# Altium footprint library M_Derogarian Altium Library.PcbLib: 137 footprints (part 4 of 9)
Each footprint in its own frame and in the unit in brackets; x right, y up, seen from the top. Pads: shape width x height; smd on the part's side, far side on the other; paste and mask are expansions set on the pad; w line width, h text height; cw(c..) or ccw(c..) is an arc to the next point about the centre after c.
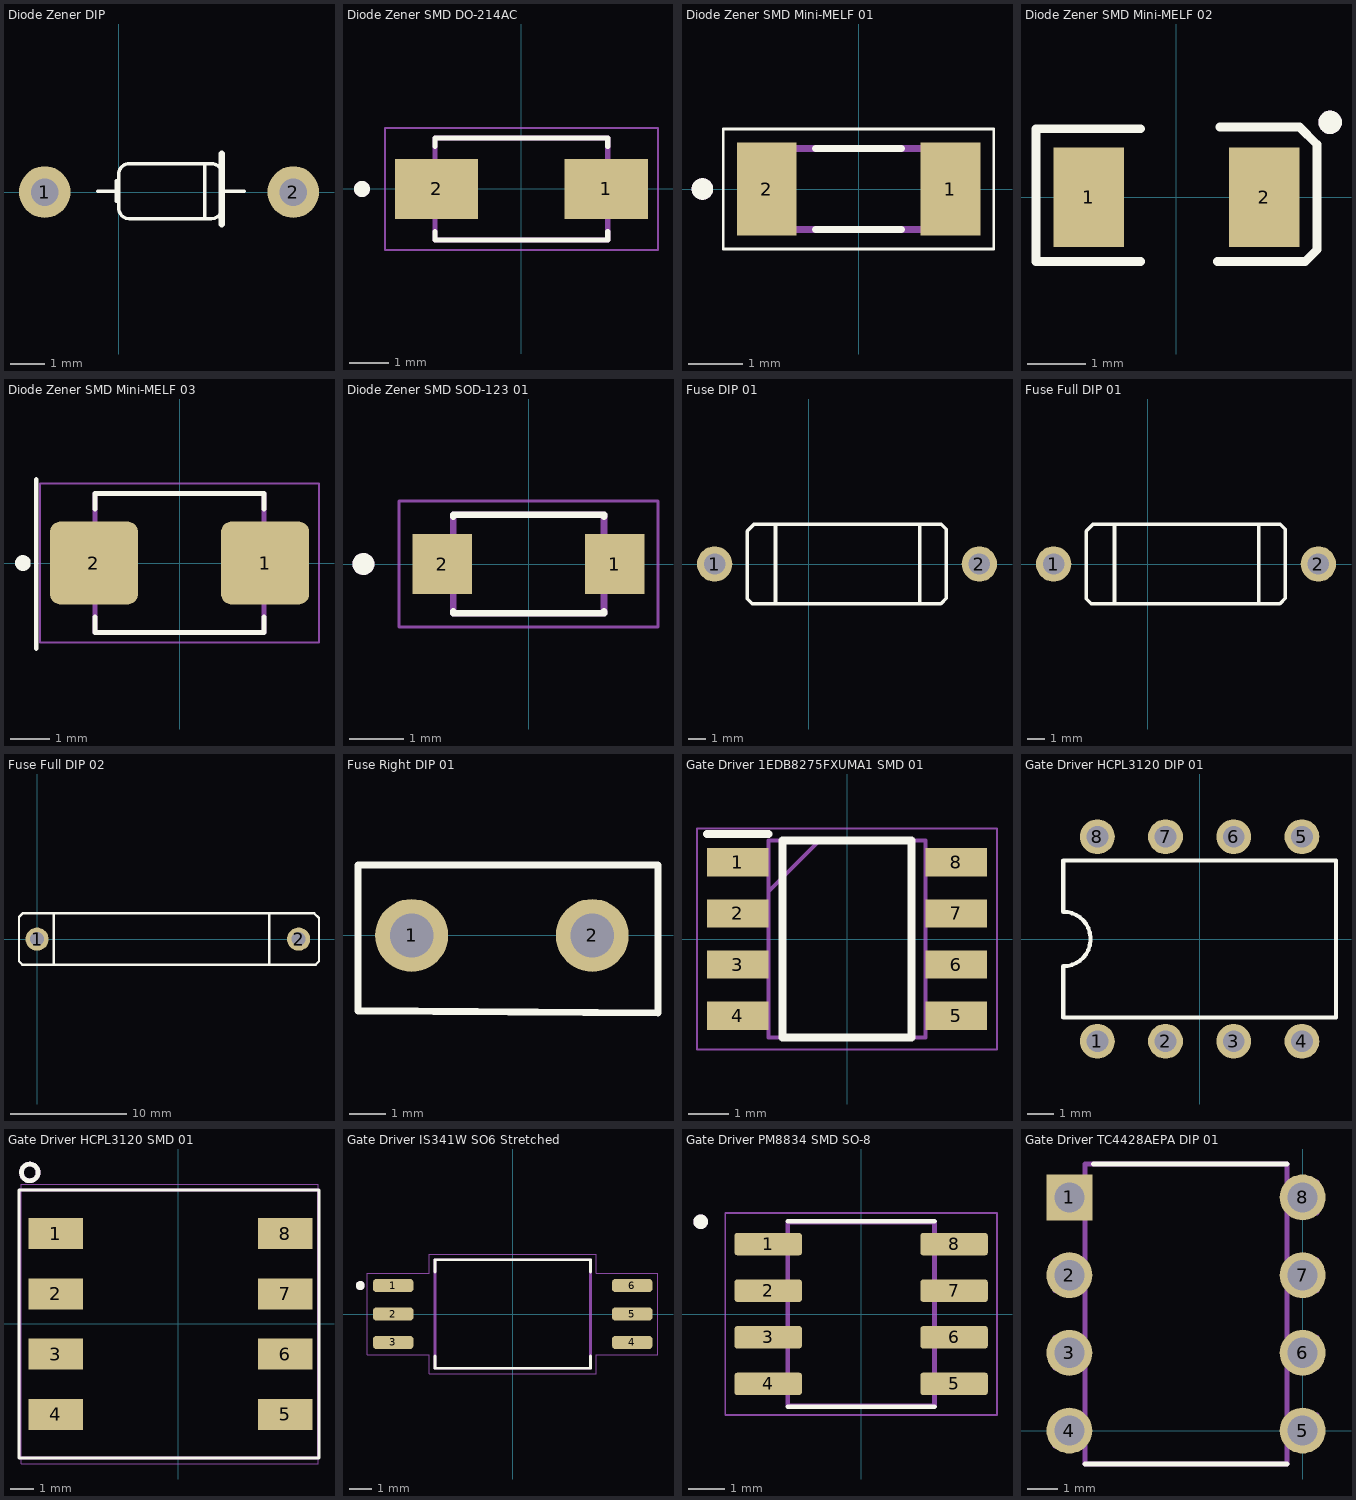
[diagram p3: the footprints below, top view; thin cyan lines are the x and y axes]

## Diode Zener DIP [mm]
pads (2):
  round 1.5 hole 0.8: 1(-2.159,0) 2(5.08,0)
Top Overlay:
  lines w0.1: -0.61,0.025 -0.101,0.025 ; -0.074,-0.275 -0.074,0.325 ; 3.658,0.025 2.999,0.025 ; 2.499,-0.775 2.699,-0.775 ccw(c2.699,-0.475) 2.999,-0.475 2.999,0.025 ; 2.499,-0.775 0.299,-0.775 cw(c0.299,-0.475) -0.001,-0.475 -0.001,0.525 cw(c0.299,0.525) 0.299,0.825 2.499,0.825 ; 2.499,-0.775 2.499,0.825 ; 2.499,0.825 2.699,0.825 cw(c2.699,0.525) 2.999,0.525 2.999,0.025
  lines w0.2: 2.995,-0.94 2.995,1.118
3D body "User Library-Diodo 1N914 (Pitch 280mils).STEP": height 1.84, standoff -2.82, extent -2.464,-0.686 5.264,0.991

## Diode Zener SMD DO-214AC [mm]
height 2.5
pads (2):
  rect 2.09x1.5 smd: 1(2.13,0) 2(-2.13,0)
Top Overlay:
  circle w0.2: c-4,0 r0.1
  lines w0.127: -2.165,-1.07 -2.165,-1.28 2.165,-1.28 2.165,-1.07 ; -2.165,1.07 -2.165,1.28 2.165,1.28 2.165,1.07
Mechanical 13:
  circle w0.2: c-4,0 r0.1
  lines w0.127: -2.165,-1.28 2.165,-1.28 2.165,1.28 -2.165,1.28 -2.165,-1.28
Mechanical 15:
  lines w0.05: -3.425,-1.53 3.425,-1.53 3.425,1.53 -3.425,1.53 -3.425,-1.53
3D body "step_temp.STEP": height 2.5, standoff 0, extent -2.57,-1.28 2.57,1.28

## Diode Zener SMD Mini-MELF 01 [mm]
pads (2):
  rect 1.11x1.73 smd: 1(1.705,0) 2(-1.705,0)
Top Overlay:
  circle w0.2: c-2.9,0 r0.1
  lines w0.05: -2.51,-1.115 2.51,-1.115 2.51,1.115 -2.51,1.115 -2.51,-1.115
  lines w0.127: -0.8,-0.75 0.8,-0.75 ; -0.8,0.75 0.8,0.75
Mechanical 13:
  circle w0.2: c-2.9,0 r0.1
  lines w0.127: -1.75,-0.75 -1.75,0.75 1.75,0.75 1.75,-0.75 -1.75,-0.75
3D body "BZT55B22 L0G.STEP": height 1.6, standoff 0, extent -1.64,-0.83 1.86,0.77

## Diode Zener SMD Mini-MELF 02 [mm]
pads (2):
  rect 1.2x1.7 smd: 1(-1.5,0) 2(1.5,0)
Top Overlay:
  circle w0.2: c2.625,1.278 r0.1
  lines w0.15: -0.611,-1.1 -2.4,-1.1 -2.4,1.17 -0.611,1.17 ; 0.7,-1.1 2.2,-1.1 2.4,-0.9 2.4,-0.5 2.4,0.9 2.1,1.2 0.74,1.2
Mechanical 13:
  circle w0.2: c2.625,1.278 r0.1
3D body "User Library-MiniMelf-2.STEP": height 1.6, standoff 0, extent -1.71,-0.81 1.99,0.79

## Diode Zener SMD Mini-MELF 03 [mm]
pads (2):
  rrect25% 2.25x2.12 smd: 1(2.185,0) 2(-2.185,0)
Top Overlay:
  circle w0.2: c-4,0 r0.1
  lines w0.127: -3.66,-2.185 -3.66,2.135 ; -2.16,-1.374 -2.16,-1.78 2.16,-1.78 2.16,-1.374 ; -2.16,1.374 -2.16,1.78 2.16,1.78 2.16,1.374
Mechanical 13:
  lines w0.127: -2.16,-1.78 2.16,-1.78 2.16,1.78 -2.16,1.78 -2.16,-1.78
Mechanical 15:
  lines w0.05: -3.56,-2.03 -3.56,2.03 3.56,2.03 3.56,-2.03 -3.56,-2.03
3D body "step_temp.STEP": height 2.49, standoff 0.02, extent -2.72,-1.78 2.72,1.78

## Diode Zener SMD SOD-123 01 [mm]
height 1.02
pads (2):
  rect 1.08x1.09 smd: 1(1.575,0) 2(-1.575,0)
Top Overlay:
  circle w0.2: c-3.015,0 r0.1
  lines w0.127: -1.375,-0.865 -1.375,-0.9 1.375,-0.9 1.375,-0.865 ; -1.375,0.865 -1.375,0.9 1.375,0.9 1.375,0.865
Mechanical 13:
  circle w0.2: c-3.015,0 r0.1
  lines w0.127: -1.375,-0.9 1.375,-0.9 1.375,0.9 -1.375,0.9 -1.375,-0.9
Mechanical 15:
  lines w0.05: -2.365,-1.15 2.365,-1.15 2.365,1.15 -2.365,1.15 -2.365,-1.15
3D body "User Library-SOD3716X14.STEP": height 1.35, standoff 0, extent -1.9,-0.8 1.8,0.75

## Fuse DIP 01 [mm]
pads (2):
  round 2 hole 1.2: 1(-5.334,0) 2(9.65,0)
Top Overlay:
  lines w0.2: -2.17,-2.25 -3.211,-2.25 -3.494,-1.967 -3.494,-0.152 -3.494,1.865 -3.109,2.25 -2.159,2.25 6.488,2.25 7.504,2.25 7.783,1.97 7.783,0.051 7.783,-1.945 7.478,-2.25 6.477,-2.25 -2.159,-2.25 ; -1.891,-2.25 -1.891,0 -1.891,2.25 ; 6.285,-2.25 6.285,0 6.285,2.25
3D body "User Library-T5A-250V.STEP": height 3.35, standoff -2.41, extent -5.641,-1.651 9.959,1.649

## Fuse Full DIP 01 [mm]
pads (2):
  round 2 hole 1.2: 1(-5.334,0) 2(9.65,0)
Top Overlay:
  lines w0.2: -2.17,-2.25 -3.211,-2.25 -3.494,-1.967 -3.494,-0.152 -3.494,1.865 -3.109,2.25 -2.159,2.25 6.488,2.25 7.504,2.25 7.783,1.97 7.783,0.051 7.783,-1.945 7.478,-2.25 6.477,-2.25 -2.159,-2.25 ; -1.891,-2.25 -1.891,0 -1.891,2.25 ; 6.285,-2.25 6.285,0 6.285,2.25
3D body "User Library-Full Fuse 5x20.STEP": height 9.5, standoff -3.95, extent -7.053,-2.87 13.047,3.039

## Fuse Full DIP 02 [mm]
pads (2):
  round 2 hole 1.2: 1(0,0) 2(22.6,0)
Top Overlay:
  lines w0.2: 1.434,-2.175 1.434,2.2 ; 20.06,2.15 20.06,-2.2 ; 20.06,-2.2 24.075,-2.2 24.358,-1.917 24.358,-1.7 24.358,1.572 24.358,1.818 23.952,2.225 23.866,2.225 23.5,2.225 -1.25,2.225 -1.56,1.915 -1.56,-0.102 -1.56,-1.917 -1.277,-2.2 17.96,-2.2 19.01,-2.2 20.06,-2.2
3D body "User Library-Fuse_Holder.STEP": height 9.44, standoff -9.4, extent -0.26,-3.95 22.9,5.05

## Fuse Right DIP 01 [mm]
pads (2):
  round 2 hole 1.2: 1(3.277,0) 2(8.23,0)
Top Overlay:
  lines w0.2: 1.803,-2.066 1.803,1.93 10.033,1.93 10.033,-2.126 1.803,-2.066
3D body "User Library-Fuse 3_6x10.STEP": height 13.7, standoff -2, extent 2.954,-2.122 10.254,1.778

## Gate Driver 1EDB8275FXUMA1 SMD 01 [mm]
pads (8):
  rect 1.525x0.7 smd: 1(-2.712,1.905) 2(-2.712,0.635) 3(-2.712,-0.635) 4(-2.712,-1.905) 5(2.712,-1.905) 6(2.712,-0.635) 7(2.712,0.635) 8(2.712,1.905)
Top Overlay:
  lines w0.2: -3.475,2.605 -1.95,2.605 ; -1.6,-2.45 -1.6,2.45 1.6,2.45 1.6,-2.45 -1.6,-2.45
Mechanical 13:
  lines w0.05: -3.725,-2.75 -3.725,2.75 3.725,2.75 3.725,-2.75 -3.725,-2.75
  lines w0.1: -1.95,1.18 -0.68,2.45 ; -1.95,-2.45 -1.95,2.45 1.95,2.45 1.95,-2.45 -1.95,-2.45
3D body "User Library-SOIC8_4_9x3_9_1_53_p1_27.STEP": height 1.55, standoff -0.11, extent -3,-2.45 3,2.45

## Gate Driver HCPL3120 DIP 01 [mm]
pads (8):
  round 1.3 hole 0.813: 1(-3.81,-3.81) 2(-1.27,-3.81) 3(1.27,-3.81) 4(3.81,-3.81) 5(3.81,3.81) 6(1.27,3.81) 7(-1.27,3.81) 8(-3.81,3.81)
Top Overlay:
  lines w0.152: -5.08,-2.921 5.08,-2.921 5.08,2.921 -5.08,2.921 -5.08,1.016 cw(c-5.08,0) -5.08,-1.016 -5.08,-2.921
3D body "HCPL-3120#060.STEP": height 4.96, standoff -2.95, extent -4.86,-3.81 4.91,3.81

## Gate Driver HCPL3120 SMD 01 [mm]
pads (8):
  rect 2.29x1.3 smd: 1(-5.156,3.81) 2(-5.156,1.27) 3(-5.156,-1.27) 4(-5.156,-3.81) 5(4.521,-3.81) 6(4.521,-1.27) 7(4.521,1.27) 8(4.521,3.81)
Top Overlay:
  circle w0.2: c-6.252,6.389 r0.352
  lines w0.127: -6.706,5.639 -6.706,3.519 -6.706,-5.65 5.944,-5.65 5.944,5.65 -4.575,5.65 -6.173,5.65 -6.694,5.65
Mechanical 13:
  circle w0.2: c-6.252,6.389 r0.352
  lines w0.127: -6.68,-5.65 5.918,-5.65 5.918,5.65 -6.68,5.65 -6.68,-5.65
Mechanical 15:
  lines w0.05: -6.604,-5.9 5.918,-5.9 5.918,5.9 -6.604,5.9 -6.604,-5.9
3D body "HCPL3120.STEP": height 4.45, standoff 0, extent -4.901,-4.749 4.749,4.901

## Gate Driver IS341W SO6 Stretched [mm]
pads (6):
  rrect50% 1.8x0.59 smd: 1(-5.33,1.27) 2(-5.33,0) 3(-5.33,-1.27) 4(5.33,-1.27) 5(5.33,0) 6(5.33,1.27)
Top Overlay:
  circle w0.2: c-6.8,1.27 r0.1
  lines w0.127: -3.47,-1.873 -3.47,-2.42 3.47,-2.42 3.47,-1.873 ; -3.47,1.873 -3.47,2.42 3.47,2.42 3.47,1.873
Mechanical 13:
  circle w0.2: c-6.8,1.27 r0.1
  lines w0.127: -3.47,-2.42 3.47,-2.42 3.47,2.42 -3.47,2.42 -3.47,-2.42
Mechanical 15:
  lines w0.05: -6.48,-1.82 -3.72,-1.82 -3.72,-2.67 3.72,-2.67 3.72,-1.82 6.48,-1.82 6.48,1.82 3.72,1.82 3.72,2.67 -3.72,2.67 -3.72,1.82 -6.48,1.82 -6.48,-1.82
3D body "User Library-SO-6W.STEP": height 3.3, standoff 0.02, extent -5.7,-2.29 5.8,2.29

## Gate Driver PM8834 SMD SO-8 [mm]
pads (8):
  rrect25% 1.84x0.61 smd: 1(-2.535,1.905) 2(-2.535,0.635) 3(-2.535,-0.635) 4(-2.535,-1.905) 5(2.535,-1.905) 6(2.535,-0.635) 7(2.535,0.635) 8(2.535,1.905)
Top Overlay:
  circle w0.2: c-4.375,2.515 r0.1
  lines w0.127: -2,-2.53 2,-2.53 ; -2,2.53 2,2.53
Mechanical 13:
  circle w0.2: c-4.375,2.515 r0.1
  lines w0.127: -2,-2.5 2,-2.5 2,2.5 -2,2.5 -2,-2.5
Mechanical 15:
  lines w0.05: -3.705,-2.75 3.705,-2.75 3.705,2.75 -3.705,2.75 -3.705,-2.75
3D body "step_temp.STEP": height 1.75, standoff 0, extent -2.997,-2.451 2.997,2.451

## Gate Driver TC4428AEPA DIP 01 [mil]
pads (8):
  rect 59x59 hole 39: 1(-300,300)
  round 59 hole 39: 2(-300,200) 3(-300,100) 4(-300,0) 5(0,0) 6(0,100) 7(0,200) 8(0,300)
Top Overlay:
  lines w6: -280,-43 -20,-43 ; -269,343 -20,343
Mechanical 13:
  lines w6: -319,-20 -319,19 -280,20 -280,-20 -319,-20 ; -319,80 -319,120 -280,120 -280,80 -319,80 ; -319,180 -319,220 -280,220 -280,180 -319,180 ; -319,280 -319,320 -280,320 -280,280 -319,280 ; -280,-43 -20,-43 -20,343 -280,343 -280,-43 ; -20,-20 -20,20 19,20 19,-19 -20,-20 ; -20,80 -20,120 19,120 19,81 -20,80 ; -20,180 -20,220 19,220 19,180 -20,180 ; -20,280 -20,320 19,320 19,280 -20,280
3D body "NE555P.STEP": height 200, standoff -125.2, extent -310.83,-34.25 11.61,343.31